# Altium footprint library PcbLib1.PcbLib: 102 footprints (part 5 of 7)
Each footprint in its own frame and in the unit in brackets; x right, y up, seen from the top. Pads: shape width x height; smd on the part's side, far side on the other; paste and mask are expansions set on the pad; w line width, h text height; cw(c..) or ccw(c..) is an arc to the next point about the centre after c.
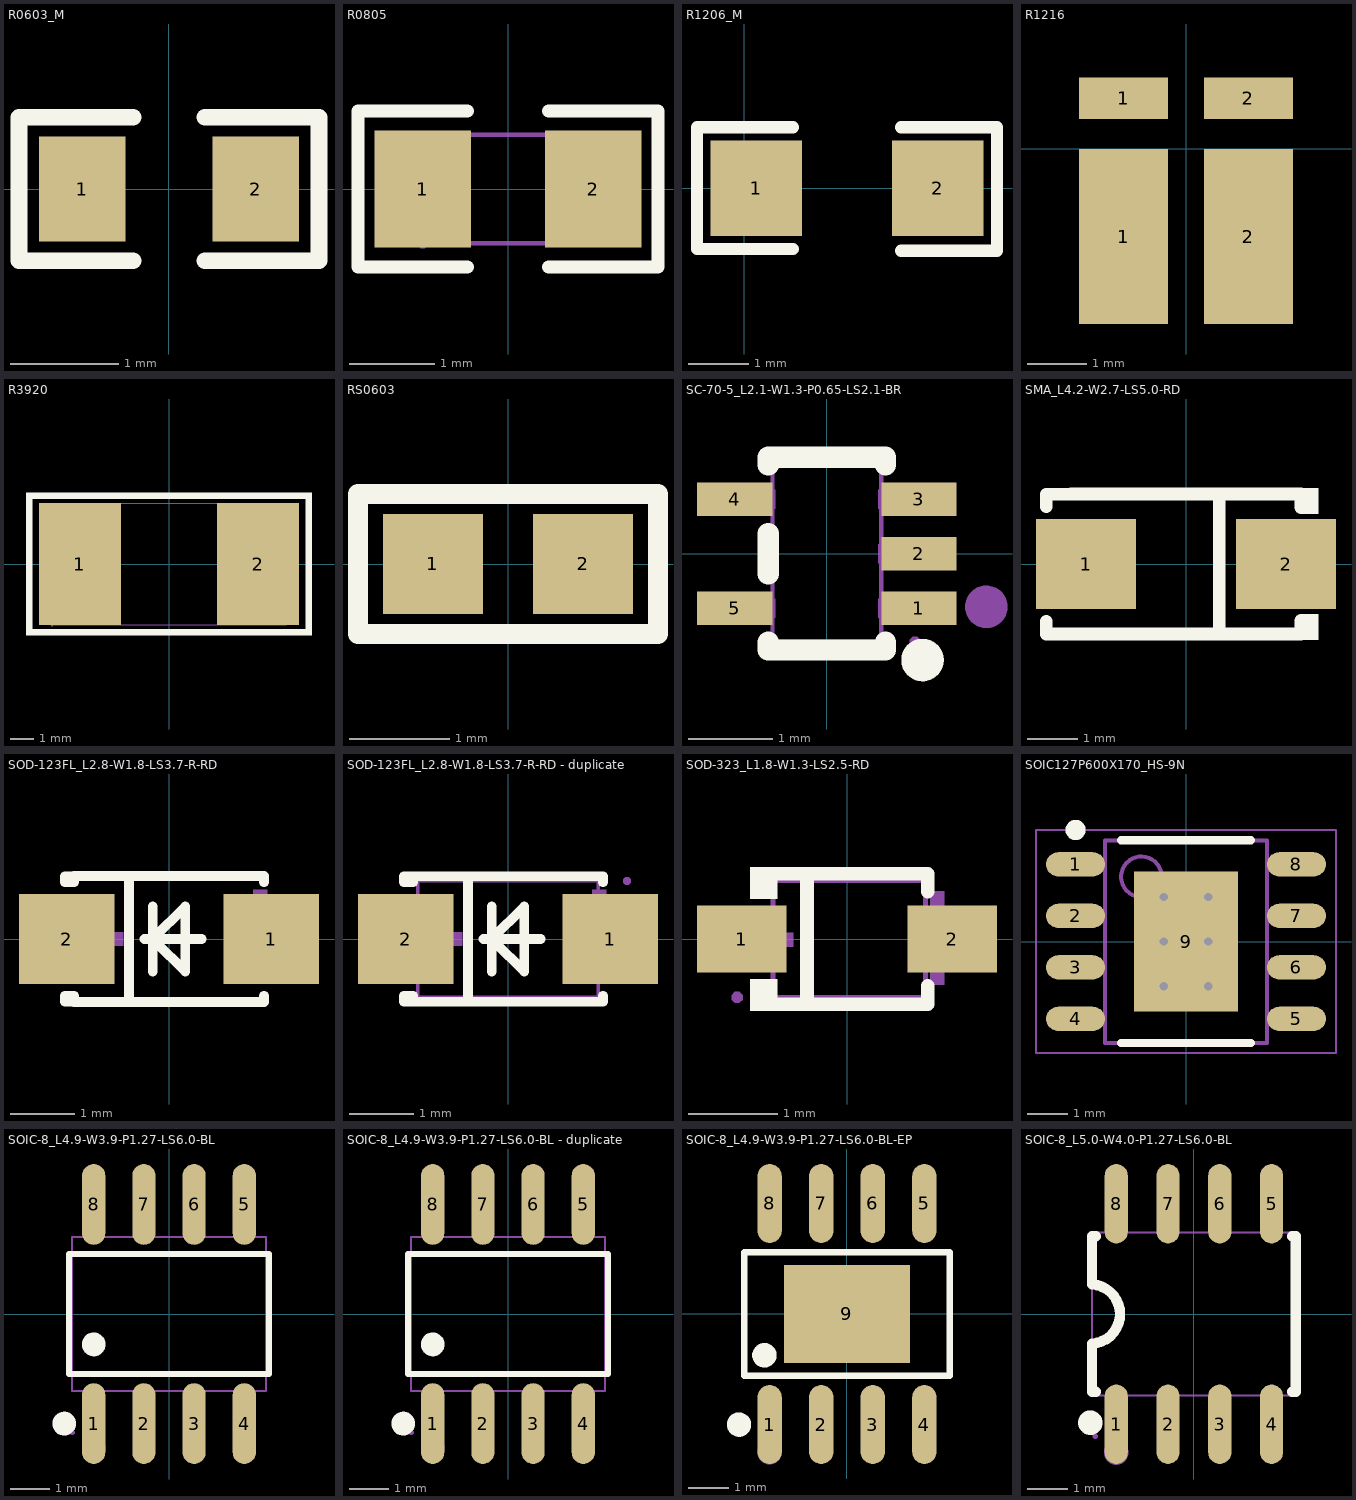
[diagram p4: the footprints below, top view; thin cyan lines are the x and y axes]

## R0603_M [mm]
pads (2):
  rect 0.8x0.965 smd: 1(-0.8,0) 2(0.8,0)
Top Overlay:
  lines w0.152: -0.33,-0.66 -1.384,-0.66 -1.384,0.66 -0.33,0.66 ; 0.33,-0.66 1.384,-0.66 1.384,0.66 0.33,0.66
3D body "RES0603.STEP": height 0.45, standoff 0, extent -0.812,-0.435 0.788,0.385

## R0805 [mm]
pads (2):
  rect 1.133x1.377 smd paste-100 mask+0.051: 1(-1,0) 2(1,0)
Top Overlay:
  lines w0.152: -0.476,-0.917 -1.761,-0.917 -1.761,0.917 -0.476,0.917 ; 0.476,-0.917 1.761,-0.917 1.761,0.917 0.476,0.917
Top Paste:
  region: -1.7,-0.64 -1.7,0.64 -1.65,0.69 -0.5,0.69 -0.45,0.64 -0.445,0.23 -0.895,0.23 -0.895,-0.22 -0.455,-0.22 -0.45,-0.64 -0.5,-0.69 -1.65,-0.69
  region: 0.45,-0.64 0.45,-0.22 0.895,-0.22 0.895,0.23 0.455,0.23 0.45,0.64 0.5,0.69 1.65,0.69 1.7,0.64 1.7,-0.64 1.65,-0.69 0.5,-0.69
Mechanical 15:
  region: -1,-0.637 -1,0.637 -0.6,0.637 -0.6,-0.637
  region: 1,-0.637 1,0.637 0.6,0.637 0.6,-0.637
  region: -0.94,-0.638 -0.94,-0.613 -0.975,-0.578 -1.025,-0.578 -1.06,-0.613 -1.06,-0.638 -1.06,-0.662 -1.025,-0.698 -0.975,-0.698 -0.94,-0.662 -0.94,-0.638
  lines w0.051: -1,-0.637 -1,0.637 1,0.637 1,-0.637 -1,-0.637
3D body "0805214.step": height 0.61, standoff 0, extent -1,-0.65 1,0.651

## R1206_M [mil]
pads (2):
  rect 60x62.99 smd: 1(8,0) 2(127,0)
Top Overlay:
  lines w8: 32,-40 -31,-40 -31,40 32,40 ; 103,-41 166,-41 166,40 103,40
3D body "R1206.STEP": height 23.62, standoff 0, extent 7.01,-31.49 133,31.5

## R1216 [mm] "HoBB1216-5W-0.25-1% C17701555"
pads (4):
  rect 1.5x2.95 smd: 1(-1.05,-1.475) 2(1.05,-1.475)
  rect 1.5x0.7 smd: 1(-1.05,0.85) 2(1.05,0.85)

## R3920 [mm]
pads (2):
  rect 3.5x5.2 smd: 1(-3.81,0) 2(3.81,0)
Top Overlay:
  region: 5.842,-3.048 -5.842,-3.048 -5.842,-2.794 5.842,-2.794
  region: 6.096,3.048 6.096,-3.048 5.842,-3.048 5.842,2.794
  region: -6.096,-3.048 -6.096,3.048 -5.842,3.048 6.096,3.048 6.096,2.794 -5.842,2.794 -5.842,-3.048
Mechanical 15:
  region: 5,-2.6 2.25,-2.6 2.25,2.6 5,2.6
  region: -5,2.6 -2.25,2.6 -2.25,-2.6 -5,-2.6
  region: -4.94,-2.6 -4.94,-2.575 -4.975,-2.54 -5.025,-2.54 -5.06,-2.575 -5.06,-2.6 -5.06,-2.625 -5.025,-2.66 -4.975,-2.66 -4.94,-2.625 -4.94,-2.6
  lines w0.051: -5,-2.6 -5,2.6 5,2.6 5,-2.6 -5,-2.6
3D body "3920.step": height 1.06, standoff 0.04, extent -4.964,-2.55 4.964,2.55

## RS0603 [mm]
pads (2):
  rect 1x1 smd paste+0 mask+0.051: 1(-0.75,0) 2(0.75,0)
Top Overlay:
  lines w0.2: -1.5,-0.7 1.5,-0.7 1.5,0.7 -1.5,0.7 -1.5,-0.7

## SC-70-5_L2.1-W1.3-P0.65-LS2.1-BR [mm]
pads (5):
  rect 0.9x0.4 smd mask+0.051: 1(1.1,-0.65) 2(1.1,0) 3(1.1,0.65) 4(-1.1,0.65) 5(-1.1,-0.65)
Top Overlay:
  circle w0.254: c1.143,-1.27 r0.127
  lines w0.254: -0.7,-1.058 -0.7,-1.15 0.7,-1.15 0.7,-1.058 ; -0.7,-0.242 -0.7,0.242 ; -0.7,1.058 -0.7,1.15 0.7,1.15 0.7,1.058
Mechanical 6:
  circle w0.254: c1.905,-0.635 r0.127
Mechanical 15:
  region: -1.05,-0.763 -1.05,-0.538 -0.69,-0.538 -0.69,-0.763
  region: -0.7,-0.763 -0.7,-0.538 -0.615,-0.538 -0.615,-0.763
  region: -1.05,0.537 -1.05,0.762 -0.69,0.762 -0.69,0.537
  region: -0.7,0.537 -0.7,0.762 -0.615,0.762 -0.615,0.537
  region: 0.69,0.537 0.69,0.762 1.05,0.762 1.05,0.537
  region: 0.615,0.537 0.615,0.762 0.7,0.762 0.7,0.537
  region: 0.69,-0.113 0.69,0.112 1.05,0.112 1.05,-0.113
  region: 0.615,-0.113 0.615,0.112 0.7,0.112 0.7,-0.113
  region: 0.69,-0.763 0.69,-0.538 1.05,-0.538 1.05,-0.763
  region: 0.615,-0.763 0.615,-0.538 0.7,-0.538 0.7,-0.763
  region: 1.113,-1.052 1.113,-1.027 1.078,-0.992 1.028,-0.992 0.993,-1.027 0.993,-1.052 0.993,-1.077 1.028,-1.112 1.078,-1.112 1.113,-1.077 1.113,-1.052
  lines w0.051: -0.65,-1.05 0.65,-1.05 0.65,1.05 -0.65,1.05 -0.65,-1.05

## SMA_L4.2-W2.7-LS5.0-RD [mm]
pads (2):
  rect 2x1.8 smd: 1(-2,0) 2(2,0)
Top Overlay:
  region: 2.653,1.005 2.653,1.524 2.297,1.524 2.297,1.005
  region: 2.653,-1.523 2.653,-1.003 2.297,-1.003 2.297,-1.523
  lines w0.254: -2.794,-1.143 -2.794,-1.4 -2.3,-1.4 2.3,-1.4 2.3,-1.131 ; -2.794,1.143 -2.794,1.397 -2.54,1.397 -2.3,1.397 ; -2.3,1.4 2.3,1.4 2.3,1.131 ; 0.667,-1.4 0.667,1.4
Mechanical 15:
  region: -2.794,0.254 -2.794,-0.127 -1.27,-0.127 -1.27,0.254
  region: 1.397,0.254 1.397,-0.127 2.794,-0.127 2.794,0.254
  region: 1.905,-0.635 2.286,-0.635 2.286,0.762 1.905,0.762

## SOD-123FL_L2.8-W1.8-LS3.7-R-RD [mm]
pads (2):
  rect 1.48x1.4 smd: 1(1.59,0) 2(-1.59,0)
Top Overlay:
  lines w0.152: -0.621,-0.976 -0.621,0.976 ; -0.381,0 0.508,0 ; -0.254,-0.508 -0.254,0.508 ; -0.254,0 0.254,0.508 0.254,0.381 0.254,-0.508 -0.209,-0.045 -0.209,0 ; 1.476,-0.88 1.476,-0.976 -1.476,-0.976 ; 1.476,0.88 1.476,0.976 -1.476,0.976 ; -1.476,-0.976 -1.62,-0.976 -1.62,-0.88 -1.476,-0.88 -1.476,-0.976 ; -1.476,0.976 -1.62,0.976 -1.62,0.88 -1.476,0.88 -1.476,0.976
Mechanical 15:
  region: 1.829,0.108 1.829,-0.108 0.965,-0.108 0.965,0.108
  region: -1.575,0.108 -1.575,-0.108 -0.711,-0.108 -0.711,0.108
  region: 1.524,0.762 1.524,-0.678 1.308,-0.678 1.308,0.762
3D body "SOD-123.STEP": height 1.1, standoff -0.04, extent -1.85,-0.9 1.85,0.9

## SOD-123FL_L2.8-W1.8-LS3.7-R-RD - duplicate [mm]
pads (2):
  rect 1.48x1.4 smd paste+0 mask+0.05: 1(1.59,0) 2(-1.59,0)
Top Overlay:
  lines w0.152: -0.621,-0.976 -0.621,0.976 ; -0.381,0 0.508,0 ; -0.254,-0.508 -0.254,0.508 ; -0.254,0 0.254,0.508 0.254,0.381 0.254,-0.508 -0.209,-0.045 -0.209,0 ; 1.476,-0.88 1.476,-0.976 -1.476,-0.976 ; 1.476,0.88 1.476,0.976 -1.476,0.976 ; -1.476,-0.976 -1.62,-0.976 -1.62,-0.88 -1.476,-0.88 -1.476,-0.976 ; -1.476,0.976 -1.62,0.976 -1.62,0.88 -1.476,0.88 -1.476,0.976
Mechanical 6:
  region: 1.829,0.108 1.829,-0.108 0.965,-0.108 0.965,0.108
  region: -1.575,0.108 -1.575,-0.108 -0.711,-0.108 -0.711,0.108
  region: 1.524,0.762 1.524,-0.678 1.308,-0.678 1.308,0.762
Mechanical 15:
  region: 1.91,0.9 1.91,0.925 1.875,0.96 1.825,0.96 1.79,0.925 1.79,0.9 1.79,0.875 1.825,0.84 1.875,0.84 1.91,0.875 1.91,0.9
  region: 1.85,0.5 1.05,0.5 1.05,-0.5 1.85,-0.5
  region: -1.85,0.5 -1.05,0.5 -1.05,-0.5 -1.85,-0.5
  lines w0.051: -1.4,-0.9 -1.4,0.9 1.4,0.9 1.4,-0.9 -1.4,-0.9
3D body "SOD-123FL214.STEP": height 0.95, standoff -0.05, extent -1.825,-0.893 1.825,0.893

## SOD-323_L1.8-W1.3-LS2.5-RD [mm] "tvs"
pads (2):
  rect 1x0.75 smd: 1(-1.173,0) 2(1.173,0)
Top Overlay:
  region: -0.775,0.802 -0.775,0.45 -1.08,0.45 -1.08,0.802
  region: -0.775,-0.802 -0.775,-0.45 -1.08,-0.45 -1.08,-0.802
  lines w0.152: -0.851,-0.726 0.901,-0.726 0.901,-0.52 ; -0.851,0.726 0.901,0.726 0.901,0.53 ; -0.447,-0.726 -0.447,0.726
Mechanical 6:
  region: -1.225,0.07 -1.225,-0.086 -0.601,-0.086 -0.601,0.07
  region: 1.315,0.09 1.315,-0.066 0.691,-0.066 0.691,0.09
  region: 1.083,0.53 1.083,-0.51 0.927,-0.51 0.927,0.53
Mechanical 15:
  region: -1.165,-0.65 -1.165,-0.625 -1.2,-0.59 -1.25,-0.59 -1.285,-0.625 -1.285,-0.65 -1.285,-0.675 -1.25,-0.71 -1.2,-0.71 -1.165,-0.675
  region: 1.275,0.16 1.275,-0.16 0.975,-0.16 0.975,0.16
  region: 0.985,0.16 0.985,-0.16 0.865,-0.16 0.865,0.16
  region: -0.925,0.16 -0.925,-0.16 -1.225,-0.16 -1.225,0.16
  region: -0.815,0.16 -0.815,-0.16 -0.935,-0.16 -0.935,0.16
  lines w0.051: -0.825,-0.65 0.875,-0.65 0.875,0.65 -0.825,0.65 -0.825,-0.65

## SOIC127P600X170_HS-9N [mm] "SOIC, 8-Leads, Body 4.90x3.90mm, Pitch 1.27mm, Thermal Pad 3.45x2.56mm, IPC Medium Density转压"
height 1.7
pads (9):
  oval 1.45x0.6 smd: 1(-2.725,1.905) 2(-2.725,0.635) 3(-2.725,-0.635) 4(-2.725,-1.905) 5(2.725,-1.905) 6(2.725,-0.635) 7(2.725,0.635) 8(2.725,1.905)
  rect 2.56x3.45 smd: 9(0,0)
via 0.55,-1.1 diameter 0.5 hole 0.2
via -0.55,-1.1 diameter 0.5 hole 0.2
via 0.55,0 diameter 0.5 hole 0.2
via -0.55,0 diameter 0.5 hole 0.2
via 0.55,1.1 diameter 0.5 hole 0.2
via -0.55,1.1 diameter 0.5 hole 0.2
Top Overlay:
  circle w0.25: c-2.725,2.755 r0.125
  lines w0.2: -1.6,-2.5 1.6,-2.5 ; -1.6,2.5 1.6,2.5
Mechanical 13:
  circle w0.1: c-1.1,1.6 r0.5
  lines w0.1: -2,-2.5 2,-2.5 2,2.5 -2,2.5 -2,-2.5
Mechanical 15:
  lines w0.05: -3.7,-2.75 3.7,-2.75 3.7,2.75 -3.7,2.75 -3.7,-2.75
  lines w0.1: -0.5,0 0.5,0 ; 0,-0.5 0,0.5
3D body "SOIC127P600X170_HS-9N.step": height 1.7, standoff 0, extent -3,-2.5 3,2.5

## SOIC-8_L4.9-W3.9-P1.27-LS6.0-BL [mm] "can芯片vp230"
pads (8):
  oval 0.588x2.045 smd: 1(-1.905,-2.772) 2(-0.635,-2.772) 3(0.635,-2.772) 4(1.905,-2.772) 5(1.905,2.772) 6(0.635,2.772) 7(-0.635,2.772) 8(-1.905,2.772)
Top Overlay:
  circle w0.3: c-2.652,-2.772 r0.15
  circle w0.3: c-1.905,-0.769 r0.15
  lines w0.152: -2.526,-1.521 2.526,-1.521 2.526,1.521 -2.526,1.521 -2.526,-1.521
Mechanical 6:
  circle w0.3: c-1.905,-3.4 r0.15
Mechanical 15:
  region: 1.695,2.175 1.695,1.94 2.115,1.94 2.115,2.175
  region: 1.695,3 1.695,2.165 2.115,2.165 2.115,3
  region: 0.425,2.175 0.425,1.94 0.845,1.94 0.845,2.175
  region: 0.425,3 0.425,2.165 0.845,2.165 0.845,3
  region: -0.845,2.175 -0.845,1.94 -0.425,1.94 -0.425,2.175
  region: -0.845,3 -0.845,2.165 -0.425,2.165 -0.425,3
  region: -2.115,2.175 -2.115,1.94 -1.695,1.94 -1.695,2.175
  region: -2.115,3 -2.115,2.165 -1.695,2.165 -1.695,3
  region: 1.695,-2.175 1.695,-1.94 2.115,-1.94 2.115,-2.175
  region: 1.695,-3 1.695,-2.165 2.115,-2.165 2.115,-3
  region: 0.425,-2.175 0.425,-1.94 0.845,-1.94 0.845,-2.175
  region: 0.425,-3 0.425,-2.165 0.845,-2.165 0.845,-3
  region: -0.845,-2.175 -0.845,-1.94 -0.425,-1.94 -0.425,-2.175
  region: -0.845,-3 -0.845,-2.165 -0.425,-2.165 -0.425,-3
  region: -2.115,-2.175 -2.115,-1.94 -1.695,-1.94 -1.695,-2.175
  region: -2.115,-3 -2.115,-2.165 -1.695,-2.165 -1.695,-3
  region: -2.39,-3 -2.39,-2.975 -2.425,-2.94 -2.475,-2.94 -2.51,-2.975 -2.51,-3 -2.51,-3.025 -2.475,-3.06 -2.425,-3.06 -2.39,-3.025
  lines w0.051: -2.45,-1.95 2.45,-1.95 2.45,1.95 -2.45,1.95 -2.45,-1.95
3D body "SOIC-8.STEP": height 1.8, standoff 0.05, extent -2.45,-3.053 2.45,3.053

## SOIC-8_L4.9-W3.9-P1.27-LS6.0-BL - duplicate [mm]
pads (8):
  oval 0.588x2.045 smd: 1(-1.905,-2.772) 2(-0.635,-2.772) 3(0.635,-2.772) 4(1.905,-2.772) 5(1.905,2.772) 6(0.635,2.772) 7(-0.635,2.772) 8(-1.905,2.772)
Top Overlay:
  circle w0.3: c-1.905,-0.769 r0.15
  circle w0.3: c-2.652,-2.772 r0.15
  lines w0.152: -2.526,-1.521 -2.526,1.521 2.526,1.521 2.526,-1.521 -2.526,-1.521
Mechanical 6:
  circle w0.3: c-1.905,-3.4 r0.15
Mechanical 15:
  region: -2.39,-3 -2.39,-2.975 -2.425,-2.94 -2.475,-2.94 -2.51,-2.975 -2.51,-3 -2.51,-3.025 -2.475,-3.06 -2.425,-3.06 -2.39,-3.025 -2.39,-3
  region: -2.115,-3 -2.115,-2.165 -1.695,-2.165 -1.695,-3
  region: -2.115,-2.175 -2.115,-1.94 -1.695,-1.94 -1.695,-2.175
  region: -0.845,-3 -0.845,-2.165 -0.425,-2.165 -0.425,-3
  region: -0.845,-2.175 -0.845,-1.94 -0.425,-1.94 -0.425,-2.175
  region: 0.425,-3 0.425,-2.165 0.845,-2.165 0.845,-3
  region: 0.425,-2.175 0.425,-1.94 0.845,-1.94 0.845,-2.175
  region: 1.695,-3 1.695,-2.165 2.115,-2.165 2.115,-3
  region: 1.695,-2.175 1.695,-1.94 2.115,-1.94 2.115,-2.175
  region: -2.115,3 -2.115,2.165 -1.695,2.165 -1.695,3
  region: -2.115,2.175 -2.115,1.94 -1.695,1.94 -1.695,2.175
  region: -0.845,3 -0.845,2.165 -0.425,2.165 -0.425,3
  region: -0.845,2.175 -0.845,1.94 -0.425,1.94 -0.425,2.175
  region: 0.425,3 0.425,2.165 0.845,2.165 0.845,3
  region: 0.425,2.175 0.425,1.94 0.845,1.94 0.845,2.175
  region: 1.695,3 1.695,2.165 2.115,2.165 2.115,3
  region: 1.695,2.175 1.695,1.94 2.115,1.94 2.115,2.175
  lines w0.051: -2.45,-1.95 -2.45,1.95 2.45,1.95 2.45,-1.95 -2.45,-1.95
3D body "SOIC-8.step": height 1.8, standoff 0.05, extent -2.45,-3.053 2.45,3.053

## SOIC-8_L4.9-W3.9-P1.27-LS6.0-BL-EP [mm]
pads (9):
  oval 0.602x1.941 smd: 1(-1.905,-2.72) 2(-0.635,-2.72) 3(0.635,-2.72) 4(1.905,-2.72) 5(1.905,2.72) 6(0.635,2.72) 7(-0.635,2.72) 8(-1.905,2.72)
  rect 3.098x2.41 smd: 9(0,0)
Top Overlay:
  circle w0.3: c-2.658,-2.721 r0.15
  circle w0.3: c-2.032,-1.016 r0.15
  lines w0.152: -2.526,-1.521 2.526,-1.521 2.526,1.521 -2.526,1.521 -2.526,-1.521
Mechanical 15:
  circle w0.3: c-1.905,-3.4 r0.15

## SOIC-8_L5.0-W4.0-P1.27-LS6.0-BL [mil] "can芯片"
pads (8):
  oval 22.38x76.78 smd: 1(-75,-106.5) 2(-25,-106.5) 3(25,-106.5) 4(75,-106.5) 5(75,106.5) 6(25,106.5) 7(-25,106.5) 8(-75,106.5)
Top Overlay:
  circle w11.81: c-100,-105 r5.91
  lines w10: -98.43,-28.61 ccw(c-99.99,0) -98.23,28.59 ; -98.42,-28.61 -98.42,-59.05 -98.42,-75 -94.83,-75 ; -98.42,28.59 -98.42,59.05 -98.42,75 -94.83,75 ; 94.83,-75 98.42,-75 98.42,-59.05 98.42,59.05 98.42,75 94.83,75
Mechanical 6:
  circle w11.81: c-75,-133.86 r5.91
Mechanical 15:
  region: -92.92,-118.11 -92.92,-117.13 -94.3,-115.75 -96.26,-115.75 -97.64,-117.13 -97.64,-118.11 -97.64,-119.09 -96.26,-120.47 -94.3,-120.47 -92.92,-119.09
  region: 66.93,76.38 66.93,85.63 83.07,85.63 83.07,76.38
  region: 66.93,85.24 66.93,118.11 83.07,118.11 83.07,85.24
  region: 16.93,76.38 16.93,85.63 33.07,85.63 33.07,76.38
  region: 16.93,85.24 16.93,118.11 33.07,118.11 33.07,85.24
  region: -33.07,76.38 -33.07,85.63 -16.93,85.63 -16.93,76.38
  region: -33.07,85.24 -33.07,118.11 -16.93,118.11 -16.93,85.24
  region: -83.07,76.38 -83.07,85.63 -66.93,85.63 -66.93,76.38
  region: -83.07,85.24 -83.07,118.11 -66.93,118.11 -66.93,85.24
  region: 66.93,-85.63 66.93,-76.38 83.07,-76.38 83.07,-85.63
  region: 66.93,-118.11 66.93,-85.24 83.07,-85.24 83.07,-118.11
  region: 16.93,-85.63 16.93,-76.38 33.07,-76.38 33.07,-85.63
  region: 16.93,-118.11 16.93,-85.24 33.07,-85.24 33.07,-118.11
  region: -33.07,-85.63 -33.07,-76.38 -16.93,-76.38 -16.93,-85.63
  region: -33.07,-118.11 -33.07,-85.24 -16.93,-85.24 -16.93,-118.11
  region: -83.07,-85.63 -83.07,-76.38 -66.93,-76.38 -66.93,-85.63
  region: -83.07,-118.11 -83.07,-85.24 -66.93,-85.24 -66.93,-118.11
  lines w2: -98.42,-78.74 -98.42,78.74 98.42,78.74 98.42,-78.74 -98.42,-78.74